# Altium footprint library Control_Board_Model.PcbLib: 160 footprints (part 10 of 10)
Each footprint in its own frame and in the unit in brackets; x right, y up, seen from the top. Pads: shape width x height; smd on the part's side, far side on the other; paste and mask are expansions set on the pad; w line width, h text height; cw(c..) or ccw(c..) is an arc to the next point about the centre after c.
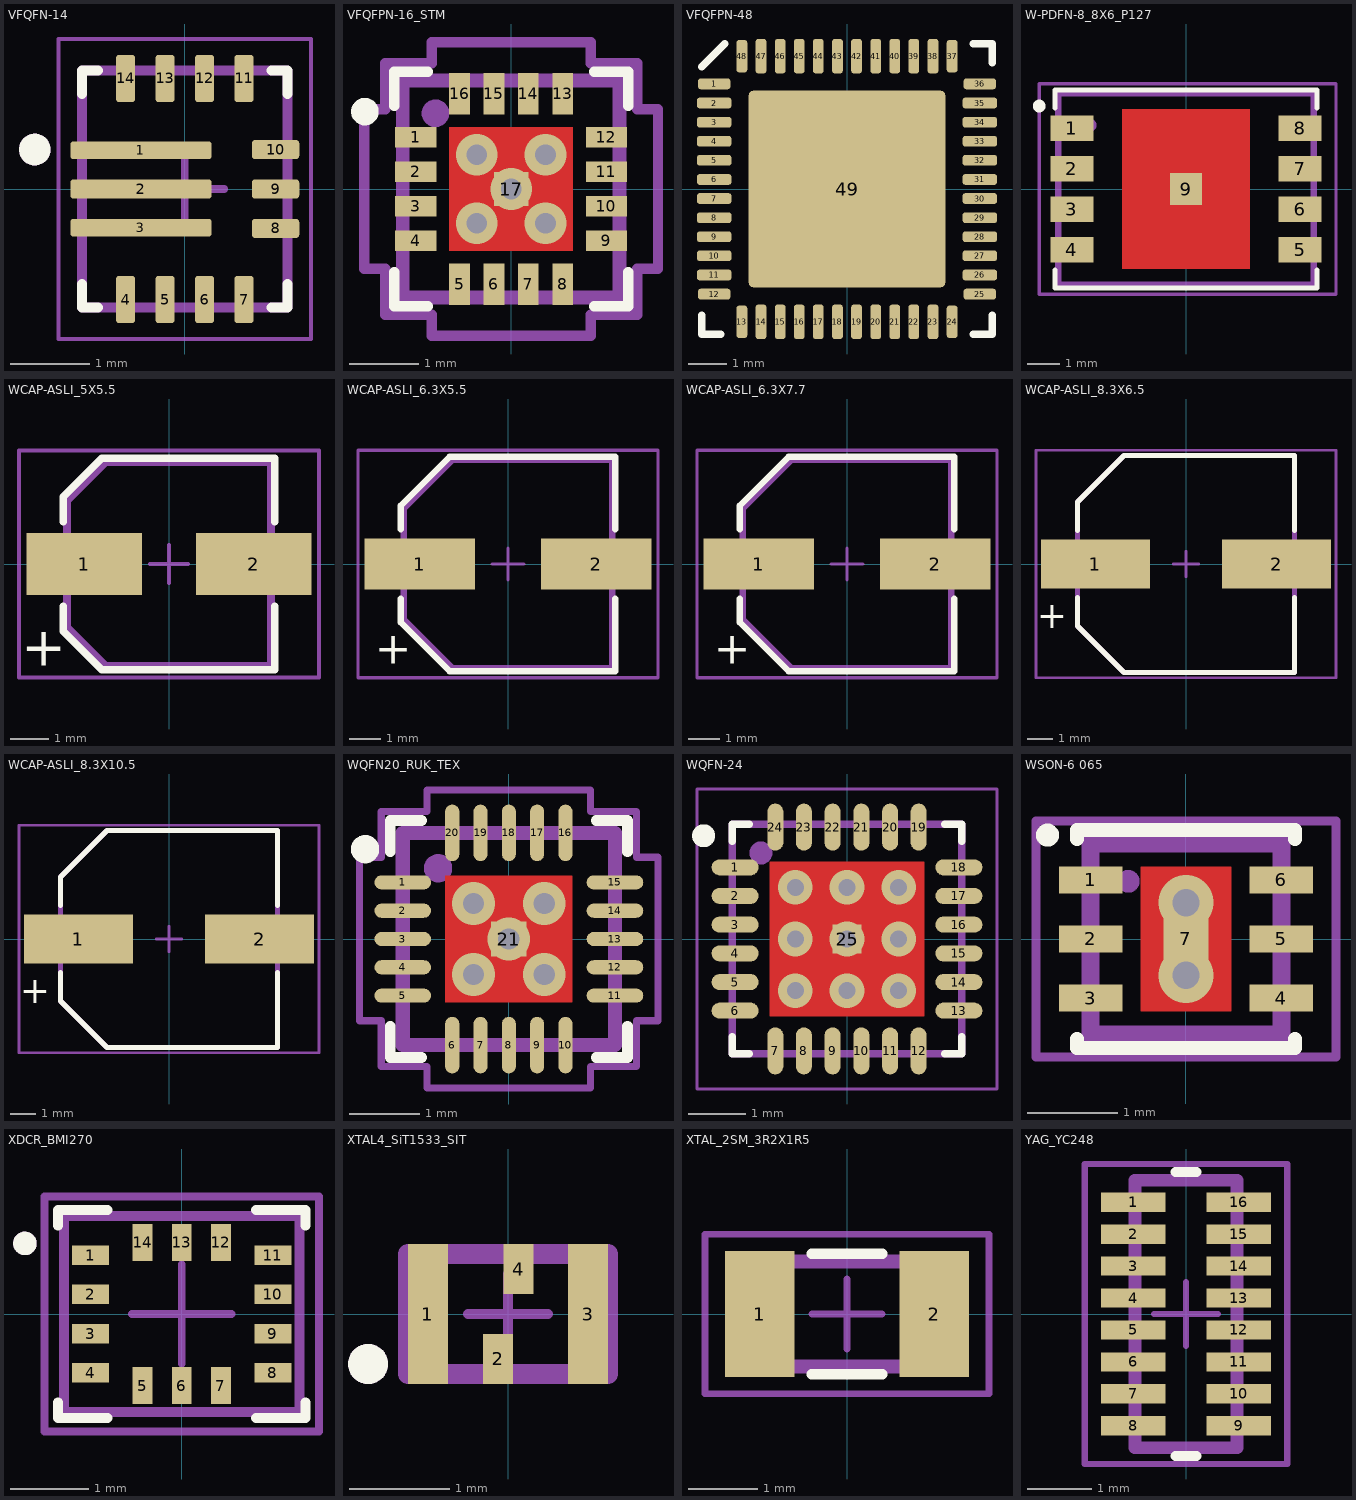
[diagram p9: the footprints below, top view; thin cyan lines are the x and y axes]

## VFQFN-14 [mm]
height 0.9
pads (14):
  rrect30% 1.79x0.22 smd paste-2 mask+0.05: 1(-0.555,0.49) 3(-0.555,-0.49)
  rrect30% 1.79x0.24 smd paste-2 mask+0.05: 2(-0.555,0)
  rrect30% 0.24x0.6 smd mask+0.05: 4(-0.75,-1.4) 5(-0.25,-1.4) 6(0.25,-1.4) 7(0.75,-1.4) 11(0.75,1.4) 12(0.25,1.4) 13(-0.25,1.4) 14(-0.75,1.4)
  rrect30% 0.6x0.24 smd mask+0.05: 8(1.15,-0.5) 9(1.15,0) 10(1.15,0.5)
Top Overlay:
  circle w0.2: c-1.9,0.5 r0.1
  lines w0.127: -1.3,-1.205 -1.3,-1.5 -1.1,-1.5 ; -1.3,1.205 -1.3,1.5 -1.1,1.5 ; 1.1,-1.5 1.3,-1.5 1.3,-1.205 ; 1.1,1.5 1.3,1.5 1.3,1.205
Top Paste:
  drawing of 6 lines, arcs and shapes, not listed
Mechanical 14:
  circle w0.2: c-1.9,0.5 r0.1
  lines w0.127: -1.3,-1.5 -1.3,1.5 ; -1.3,-1.5 1.3,-1.5 ; -1.3,-1.5 1.3,-1.5 ; -1.3,1.5 1.3,1.5 ; -1.3,1.5 1.3,1.5 ; 1.3,-1.5 1.3,1.5
Mechanical 15:
  lines w0.05: -1.6,-1.9 -1.6,1.9 1.6,1.9 1.6,-1.9 -1.6,-1.9
  lines w0.1: -0.5,0 0.5,0 ; 0,-0.5 0,0.5
3D body: height 0.9, standoff 0, extent -1.299,-1.499 1.299,1.499

## VFQFPN-16_STM [mm]
pads (17):
  rect 0.6x0.3 smd mask+0.05: 1(-1.385,0.75) 2(-1.385,0.25) 3(-1.385,-0.25) 4(-1.385,-0.75) 9(1.385,-0.75) 10(1.385,-0.25) 11(1.385,0.25) 12(1.385,0.75)
  rect 0.3x0.6 smd mask+0.05: 5(-0.75,-1.385) 6(-0.25,-1.385) 7(0.25,-1.385) 8(0.75,-1.385) 13(0.75,1.385) 14(0.25,1.385) 15(-0.25,1.385) 16(-0.75,1.385)
  rect 0.5x0.5 smd mask+0.05: 17(0,0)
via 0,0 diameter 0.605 hole 0.3
via 0.5,-0.5 diameter 0.605 hole 0.3
via -0.5,-0.5 diameter 0.605 hole 0.3
via 0.5,0.5 diameter 0.605 hole 0.3
via -0.5,0.5 diameter 0.605 hole 0.3
Top Layer:
  rectangle: -0.9,-0.9 0.9,0.9
Top Overlay:
  circle w0.2: c-2.125,1.125 r0.1
  lines w0.152: -1.702,-1.21 -1.702,-1.702 -1.21,-1.702 ; -1.702,1.21 -1.702,1.702 -1.21,1.702 ; 1.21,-1.702 1.702,-1.702 1.702,-1.21 ; 1.21,1.702 1.702,1.702 1.702,1.21
Top Paste:
  rectangle: -0.9,-0.9 0.9,0.9
Top Solder:
  rectangle: -0.95,-0.95 0.95,0.95
Mechanical 14:
  circle w0.2: c-1.1,1.1 r0.1
  lines w0.2: -1.575,-1.575 1.575,-1.575 1.575,1.575 -1.575,1.575 -1.575,-1.575
  text "'.Designator'" at -1,-0.2 h0.5
Mechanical 15:
  lines w0.1: -0.5,0 0.5,0 ; 0,-0.5 0,0.5
  lines w0.152: -2.134,-1.156 -1.829,-1.156 -1.829,-1.829 -1.156,-1.829 -1.156,-2.134 1.156,-2.134 1.156,-1.829 1.829,-1.829 1.829,-1.156 2.134,-1.156 2.134,1.156 1.829,1.156 1.829,1.829 1.156,1.829 1.156,2.134 -1.156,2.134 -1.156,1.829 -1.829,1.829 -1.829,1.156 -2.134,1.156 -2.134,-1.156
3D body "VFQFPN-16_STM.step": height 0.94, standoff 0, extent -1.575,-1.575 1.575,1.575

## VFQFPN-48 [mm]
pads (49):
  rrect50% 0.85x0.28 smd: 1(-3.475,2.75) 12(-3.475,-2.75) 25(3.475,-2.75) 36(3.475,2.75)
  rrect50% 0.9x0.28 smd: 2(-3.475,2.25) 3(-3.475,1.75) 4(-3.475,1.25) 5(-3.475,0.75) 6(-3.475,0.25) 7(-3.475,-0.25) 8(-3.475,-0.75) 9(-3.475,-1.25) 10(-3.475,-1.75) 11(-3.475,-2.25) 26(3.475,-2.25) 27(3.475,-1.75) 28(3.475,-1.25) 29(3.475,-0.75) 30(3.475,-0.25) 31(3.475,0.25) 32(3.475,0.75) 33(3.475,1.25) 34(3.475,1.75) 35(3.475,2.25)
  rrect50% 0.28x0.85 smd: 13(-2.75,-3.475) 24(2.75,-3.475) 37(2.75,3.475) 48(-2.75,3.475)
  rrect50% 0.28x0.9 smd: 14(-2.25,-3.475) 15(-1.75,-3.475) 16(-1.25,-3.475) 17(-0.75,-3.475) 18(-0.25,-3.475) 19(0.25,-3.475) 20(0.75,-3.475) 21(1.25,-3.475) 22(1.75,-3.475) 23(2.25,-3.475) 38(2.25,3.475) 39(1.75,3.475) 40(1.25,3.475) 41(0.75,3.475) 42(0.25,3.475) 43(-0.25,3.475) 44(-0.75,3.475) 45(-1.25,3.475) 46(-1.75,3.475) 47(-2.25,3.475)
  rrect5% 5.15x5.15 smd: 49(0,0)
Top Overlay:
  lines w0.2: -3.8,-3.3 -3.8,-3.8 -3.3,-3.8 ; -3.8,3.2 -3.2,3.8 ; 3.3,-3.8 3.8,-3.8 3.8,-3.3 ; 3.3,3.8 3.8,3.8 3.8,3.3
3D body "ALSRobot-QFN48 7x7.step": height 0.78, standoff -0.02, extent -3.51,-3.51 3.51,3.51

## W-PDFN-8_8X6_P127 [mm]
pads (9):
  rect 1.35x0.8 smd mask+0.05: 1(-3.575,1.905) 2(-3.575,0.635) 3(-3.575,-0.635) 4(-3.575,-1.905) 5(3.575,-1.905) 6(3.575,-0.635) 7(3.575,0.635) 8(3.575,1.905)
  rect 1x1 smd mask+0.05: 9(0,0)
Top Layer:
  rectangle: -2,-2.5 2,2.5
Top Overlay:
  circle w0.2: c-4.6,2.6 r0.1
  lines w0.152: -4.1,-2.54 -4.1,-3.1 4.1,-3.1 4.1,-2.54 ; -4.1,2.54 -4.1,3.1 4.1,3.1 4.1,2.54
Top Paste:
  rectangle: -2,-2.5 2,2.5
Top Solder:
  rectangle: -2.05,-2.55 2.05,2.55
Mechanical 14:
  circle w0.2: c-3,2 r0.1
  lines w0.2: 4,3 -4,3 -4,-3 4,-3 4,3 ; 4,3 4,3
  text ".Designator" at -1.1,-0.2 h0.5
Mechanical 15:
  lines w0.1: -0.635,0 0.635,0 ; 0,-0.635 0,0.635 ; -4.6,-3.3 -4.6,3.3 4.7,3.3 4.7,-3.3 -4.6,-3.3
3D body: height 0.8, standoff 0, extent -4.005,-3.005 4.005,3.005

## WCAP-ASLI_5X5.5 [mm] "Aluminium Electrolytic V-Chip SMT Capacitors, 5x5.5mm"
height 5.5
pads (2):
  rect 3x1.6 smd: 1(-2.2,0) 2(2.2,0)
Top Overlay:
  lines w0.2: -2.75,-1.1 -2.75,-1.75 -1.75,-2.75 2.75,-2.75 2.75,-1.1 ; -2.75,1.1 -2.75,1.75 -1.75,2.75 2.75,2.75 2.75,1.1
  text "+" at -2.667,-1.778 h1.02
Mechanical 14:
  lines w0.2: -2.65,-1.65 -1.65,-2.65 2.65,-2.65 2.65,2.65 -1.65,2.65 -2.65,1.65 -2.65,-1.65
  text "'.Designator'" at 0.254,-0.635 h0.5
  text "+" at -1.524,0.508 h1.02
Mechanical 15:
  lines w0.1: -0.5,0 0.5,0 ; 0,-0.5 0,0.5 ; -3.9,-2.95 -3.9,2.95 3.9,2.95 3.9,-2.95 -3.9,-2.95
3D body "5x5.5x1.4.stp": height 5.5, standoff 0, extent -3,-2.65 3,2.65

## WCAP-ASLI_6.3X5.5 [mm] "Aluminium Electrolytic V-Chip SMT Capacitors, 6.3x5.5mm"
height 5.5
pads (2):
  rect 3.5x1.6 smd: 1(-2.8,0) 2(2.8,0)
Top Overlay:
  lines w0.2: -3.4,-1.1 -3.4,-1.85 -1.85,-3.4 3.4,-3.4 3.4,-1.1 ; -3.4,1.1 -3.4,1.85 -1.85,3.4 3.4,3.4 3.4,1.1
  text "+" at -3.048,-2.286 h1.02
Mechanical 14:
  lines w0.2: -3.3,-1.75 -1.75,-3.3 3.3,-3.3 3.3,3.3 -1.75,3.3 -3.3,1.75 -3.3,-1.75
  text "'.Designator'" at -0.635,0 h0.5
  text "+" at -2.159,0.508 h1.02
Mechanical 15:
  lines w0.1: -0.5,0 0.5,0 ; 0,-0.5 0,0.5 ; -4.75,-3.6 -4.75,3.6 4.75,3.6 4.75,-3.6 -4.75,-3.6
3D body "6.3x5.5x2.2.stp": height 5.5, standoff 0, extent -3.65,-3.3 3.65,3.3

## WCAP-ASLI_6.3X7.7 [mm] "Aluminium Electrolytic V-Chip SMT Capacitors, 6.3x7.7mm"
pads (2):
  rect 3.5x1.6 smd: 1(-2.8,0) 2(2.8,0)
Top Overlay:
  lines w0.2: -3.4,-1.1 -3.4,-1.85 -1.85,-3.4 3.4,-3.4 3.4,-1.1 ; -3.4,1.1 -3.4,1.85 -1.85,3.4 3.4,3.4 3.4,1.1
  text "+" at -3.048,-2.286 h1.02
Mechanical 14:
  lines w0.2: -3.3,-1.75 -3.3,1.75 -1.75,3.3 3.3,3.3 3.3,-3.3 -1.75,-3.3 -3.3,-1.75
  text "+" at -2.159,0.508 h1.02
  text "'.Designator'" at -0.635,0 h0.5
Mechanical 15:
  lines w0.1: -0.5,0 0.5,0 ; 0,-0.5 0,0.5 ; -4.75,-3.6 4.75,-3.6 4.75,3.6 -4.75,3.6 -4.75,-3.6
3D body "Download_STP_865060x4500x (rev1).stp": height 7.55, standoff -0.15, extent -3.65,-3.3 3.65,3.3

## WCAP-ASLI_8.3X6.5 [mm] "Aluminium Electrolytic V-Chip SMT Capacitors, 8.3x6.5mm"
pads (2):
  rect 4.2x1.9 smd: 1(-3.5,0) 2(3.5,0)
Top Overlay:
  lines w0.2: -4.2,-1.3 -4.2,-2.4 -2.4,-4.2 4.2,-4.2 4.2,-1.3 ; -4.2,1.3 -4.2,2.4 -2.4,4.2 4.2,4.2 4.2,1.3
  text "+" at -4.6,-1.6 h1.02
Mechanical 14:
  lines w0.2: -4.2,-2.4 -4.2,2.4 -2.4,4.2 4.2,4.2 4.2,-4.2 -2.4,-4.2 -4.2,-2.4
  text "'.Designator'" at -0.635,0 h0.5
  text "+" at -2.159,0.508 h1.02
Mechanical 15:
  lines w0.1: -0.5,0 0.5,0 ; 0,-0.5 0,0.5 ; -5.8,-4.4 -5.8,4.4 5.8,4.4 5.8,-4.4 -5.8,-4.4
3D body "Download_STP_865080x4901x (rev1).stp": height 6.35, standoff -0.15, extent -4.5,-4.1 4.5,4.2

## WCAP-ASLI_8.3X10.5 [mm] "Aluminium Electrolytic V-Chip SMT Capacitors, 8.3x10.5mm"
pads (2):
  rect 4.2x1.9 smd: 1(-3.5,0) 2(3.5,0)
Top Overlay:
  lines w0.2: -4.2,-1.3 -4.2,-2.4 -2.4,-4.2 4.2,-4.2 4.2,-1.3 ; -4.2,1.3 -4.2,2.4 -2.4,4.2 4.2,4.2 4.2,1.3
  text "+" at -4.6,-1.6 h1.02
Mechanical 14:
  lines w0.2: -4.2,-2.4 -2.4,-4.2 4.2,-4.2 4.2,4.2 -2.4,4.2 -4.2,2.4 -4.2,-2.4
  text "+" at -2.159,0.508 h1.02
  text "'.Designator'" at -0.635,0 h0.5
Mechanical 15:
  lines w0.1: -0.5,0 0.5,0 ; 0,-0.5 0,0.5 ; -5.8,-4.4 5.8,-4.4 5.8,4.4 -5.8,4.4 -5.8,-4.4
3D body "Download_STP_86508xx530xx (rev1).stp": height 10.35, standoff -0.15, extent -4.5,-4.15 4.5,4.15

## WQFN20_RUK_TEX [mm]
pads (21):
  rrect100% 0.8x0.2 smd mask+0.05: 1(-1.5,0.8) 2(-1.5,0.4) 3(-1.5,0) 4(-1.5,-0.4) 5(-1.5,-0.8) 11(1.5,-0.8) 12(1.5,-0.4) 13(1.5,0) 14(1.5,0.4) 15(1.5,0.8)
  rrect100% 0.2x0.8 smd mask+0.05: 6(-0.8,-1.5) 7(-0.4,-1.5) 8(0,-1.5) 9(0.4,-1.5) 10(0.8,-1.5) 16(0.8,1.5) 17(0.4,1.5) 18(0,1.5) 19(-0.4,1.5) 20(-0.8,1.5)
  rect 0.5x0.5 smd paste-2 mask+0.05: 21(0,0)
via 0,0 diameter 0.605 hole 0.3
via -0.5,0.5 diameter 0.605 hole 0.3
via 0.5,0.5 diameter 0.605 hole 0.3
via -0.5,-0.5 diameter 0.605 hole 0.3
via 0.5,-0.5 diameter 0.605 hole 0.3
Top Layer:
  rectangle: -0.9,-0.9 0.9,0.9
Top Overlay:
  circle w0.2: c-2.032,1.27 r0.1
  lines w0.152: -1.676,-1.234 -1.676,-1.676 -1.234,-1.676 ; -1.676,1.234 -1.676,1.676 -1.234,1.676 ; 1.234,-1.676 1.676,-1.676 1.676,-1.234 ; 1.234,1.676 1.676,1.676 1.676,1.234
Top Paste:
  rectangle: -0.85,0.15 -0.15,0.85
  region: -0.15,-0.85 -0.15,-0.15 -0.85,-0.15 -0.85,-0.85
  region: 0.85,-0.15 0.15,-0.15 0.15,-0.85 0.85,-0.85
  region: 0.15,0.85 0.15,0.15 0.85,0.15 0.85,0.85
Top Solder:
  rectangle: -0.95,-0.95 0.95,0.95
Mechanical 14:
  circle w0.2: c-1,1 r0.1
  lines w0.2: -1.5,-1.5 1.5,-1.5 1.5,1.5 -1.5,1.5 -1.5,-1.5
  text "'.Designator'" at -0.8,-0.3 h0.5
Mechanical 15:
  lines w0.1: -0.5,0 0.5,0 ; 0,-0.5 0,0.5 ; -2.108,-1.156 -1.803,-1.156 -1.803,-1.803 -1.156,-1.803 -1.156,-2.108 1.156,-2.108 1.156,-1.803 1.803,-1.803 1.803,-1.156 2.108,-1.156 2.108,1.156 1.803,1.156 1.803,1.803 1.156,1.803 1.156,2.108 -1.156,2.108 -1.156,1.803 -1.803,1.803 -1.803,1.156 -2.108,1.156 -2.108,-1.156
3D body "RUK0020B.stp": height 0.8, standoff 0, extent -1.5,-1.5 1.5,1.5

## WQFN-24 [mm] "WQFN24 Plastic Quad Flatpack No-Lead"
height 0.8
pads (25):
  rrect100% 0.82x0.28 smd paste-0.025 mask+0.05: 1(-1.95,1.25) 2(-1.95,0.75) 3(-1.95,0.25) 4(-1.95,-0.25) 5(-1.95,-0.75) 6(-1.95,-1.25) 13(1.95,-1.25) 14(1.95,-0.75) 15(1.95,-0.25) 16(1.95,0.25) 17(1.95,0.75) 18(1.95,1.25)
  rrect100% 0.28x0.82 smd paste-0.025 mask+0.05: 7(-1.25,-1.95) 8(-0.75,-1.95) 9(-0.25,-1.95) 10(0.25,-1.95) 11(0.75,-1.95) 12(1.25,-1.95) 19(1.25,1.95) 20(0.75,1.95) 21(0.25,1.95) 22(-0.25,1.95) 23(-0.75,1.95) 24(-1.25,1.95)
  rect 0.5x0.5 smd paste-5 mask+0.05: 25(0,0)
via 0.9,-0.9 diameter 0.605 hole 0.3
via 0,-0.9 diameter 0.605 hole 0.3
via -0.9,-0.9 diameter 0.605 hole 0.3
via -0.9,0.9 diameter 0.605 hole 0.3
via 0,0.9 diameter 0.605 hole 0.3
via 0.9,0.9 diameter 0.605 hole 0.3
via 0.9,0 diameter 0.605 hole 0.3
via -0.9,0 diameter 0.605 hole 0.3
via 0,0 diameter 0.605 hole 0.3
Top Layer:
  rectangle: -1.35,-1.35 1.35,1.35
Top Overlay:
  circle w0.2: c-2.5,1.8 r0.1
  lines w0.127: -2,-1.705 -2,-2 -1.705,-2 ; -2,1.705 -2,2 -1.705,2 ; 1.705,-2 2,-2 2,-1.705 ; 1.705,2 2,2 2,1.705
Top Paste:
  rectangle: -1.25,0.15 -0.15,1.25
  region: -0.15,-1.25 -0.15,-0.15 -1.25,-0.15 -1.25,-1.25
  region: 1.25,-0.15 0.15,-0.15 0.15,-1.25 1.25,-1.25
  region: 0.15,1.25 0.15,0.15 1.25,0.15 1.25,1.25
Top Solder:
  rectangle: -1.4,-1.4 1.4,1.4
Mechanical 14:
  circle w0.2: c-1.5,1.5 r0.1
  lines w0.127: -2,-2 2,-2 ; -2,-2 -2,2 ; -2,-2 2,-2 ; -2,-2 -2,2 ; -2,2 2,2 ; -2,2 2,2 ; 2,-2 2,2 ; 2,-2 2,2
  text "'.Designator'" at -0.9,-0.2 h0.5
Mechanical 15:
  lines w0.05: -2.615,-2.615 2.615,-2.615 2.615,2.615 -2.615,2.615 -2.615,-2.615
  lines w0.1: -0.5,0 0.5,0 ; 0,-0.5 0,0.5
3D body "BQ25611DRTWT.STEP": height 0.8, standoff 0, extent -2,-2 2,2

## WSON-6 065 [mm]
height 0.8
pads (7):
  rect 0.7x0.3 smd mask+0.05: 1(-1.05,0.65) 2(-1.05,0) 3(-1.05,-0.65) 4(1.05,-0.65) 5(1.05,0) 6(1.05,0.65)
  rect 0.5x0.5 smd mask+0.05: 7(0,0)
via 0,0.4 diameter 0.605 hole 0.3
via 0,-0.4 diameter 0.605 hole 0.3
Top Layer:
  rectangle: -0.5,-0.8 0.5,0.8
Top Overlay:
  circle w0.152: c-1.524,1.143 r0.051
  lines w0.152: -1.2,-1.1 -1.2,-1.2 1.2,-1.2 1.2,-1.1 ; -1.2,1.1 -1.2,1.2 1.2,1.2 1.2,1.1
Top Paste:
  rectangle: -0.5,-0.8 0.5,0.8
Top Solder:
  rectangle: -0.55,-0.85 0.55,0.85
Mechanical 14:
  circle w0.15: c-0.635,0.635 r0.05
  lines w0.2: -1.05,-1.05 -1.05,1.05 1.05,1.05 1.05,-1.05 -1.05,-1.05
  text "'.Designator'" at 0.254,-0.635 h0.5
Mechanical 15:
  lines w0.1: -0.4,0 0.4,0 ; 0,-0.4 0,0.4 ; -1.651,-1.3 1.651,-1.3 1.651,1.3 -1.651,1.3 -1.651,-1.3
3D body "WSON-6.STEP": height 0.8, standoff 0, extent -1.05,-1.05 1.05,1.05

## XDCR_BMI270 [mm]
pads (14):
  rect 0.475x0.25 smd mask+0.05: 1(-1.162,0.75) 2(-1.162,0.25) 3(-1.162,-0.25) 4(-1.162,-0.75) 8(1.162,-0.75) 9(1.162,-0.25) 10(1.162,0.25) 11(1.162,0.75)
  rect 0.25x0.475 smd mask+0.05: 5(-0.5,-0.913) 6(0,-0.913) 7(0.5,-0.913) 12(0.5,0.913) 13(0,0.913) 14(-0.5,0.913)
Top Overlay:
  circle w0.15: c-2,0.9 r0.075
  lines w0.127: -1.575,-1.125 -1.575,-1.325 -0.945,-1.325 ; -1.575,1.125 -1.575,1.325 -0.945,1.325 ; 0.945,-1.325 1.575,-1.325 1.575,-1.125 ; 0.945,1.325 1.575,1.325 1.575,1.125
Mechanical 14:
  circle w0.15: c-2,0.9 r0.075
  lines w0.127: -1.5,-1.25 -1.5,1.25 1.5,1.25 1.5,-1.25 -1.5,-1.25
  text "'.Designator'" at -0.9,-0.2 h0.5
Mechanical 15:
  lines w0.1: -0.635,0 0.635,0 ; 0,-0.635 0,0.635 ; -1.75,-1.5 1.75,-1.5 1.75,1.5 -1.75,1.5 -1.75,-1.5
3D body "User Library-LGA-14 2_5x3-1.STEP": height 0.86, standoff 0, extent -1.5,-1.25 1.5,1.25

## XTAL4_SiT1533_SIT [mm]
pads (4):
  rect 0.4x1.4 smd paste+0 mask+0.05: 1(-0.8,0) 3(0.8,0)
  rect 0.3x0.5 smd paste+0 mask+0.05: 2(-0.099,-0.45) 4(0.106,0.45)
Top Overlay:
  circle w0.2: c-1.4,-0.5 r0.1
Mechanical 14:
  circle w0.2: c-1.4,-0.5 r0.1
  lines w0.2: -1,-0.6 -1,0.6 1,0.6 1,-0.6 -1,-0.6
  text "'.Designator'" at -0.7,-0.3 h0.5
Mechanical 15:
  lines w0.1: -0.4,0 0.4,0 ; 0,-0.4 0,0.4 ; -1,0 -1,0.6 0,0.6 1,0.6 1,0 ; -1,0 -1.003,0 -1,0 ; -1,0 -1,-0.6 0,-0.6 1,-0.6 1,0 ; 1,0 1.003,0 1,0
3D body "SMD_2012_4pins.stp": height 0.55, standoff -0.05, extent -1,-0.6 1,0.6

## XTAL_2SM_3R2X1R5 [mm]
pads (2):
  rect 1x1.8 smd: 1(-1.25,0) 2(1.25,0)
Top Overlay:
  lines w0.152: -0.508,-0.864 0.508,-0.864 ; -0.508,0.864 0.508,0.864
Mechanical 14:
  lines w0.2: -1.6,-0.75 1.6,-0.75 1.6,0.75 -1.6,0.75 -1.6,-0.75
  text ".Designator" at -1.1,-0.2 h0.5
Mechanical 15:
  lines w0.1: -0.5,0 0.5,0 ; 0,-0.5 0,0.5 ; -2.032,-1.143 2.032,-1.143 2.032,1.143 -2.032,1.143 -2.032,-1.143
3D body: height 0.8, standoff 0, extent -1.6,-0.75 1.6,0.75

## YAG_YC248 [mm]
pads (16):
  rect 1.016x0.3 smd: 1(-0.826,1.75) 2(-0.826,1.25) 3(-0.826,0.75) 4(-0.826,0.25) 5(-0.826,-0.25) 6(-0.826,-0.75) 7(-0.826,-1.25) 8(-0.826,-1.75) 9(0.826,-1.75) 10(0.826,-1.25) 11(0.826,-0.75) 12(0.826,-0.25) 13(0.826,0.25) 14(0.826,0.75) 15(0.826,1.25) 16(0.826,1.75)
Top Overlay:
  lines w0.152: -0.163,-2.222 0.163,-2.222 ; -0.163,2.222 0.163,2.222
Mechanical 13:
  lines w0: -0.8,-1.572 ccw(c-0.8,-1.5) -0.8,-1.428 ; -0.8,-1.072 ccw(c-0.8,-1) -0.8,-0.928 ; -0.8,-0.572 ccw(c-0.8,-0.5) -0.8,-0.428 ; -0.8,-0.072 ccw(c-0.8,0) -0.8,0.072 ; -0.8,0.428 ccw(c-0.8,0.5) -0.8,0.572 ; -0.8,0.928 ccw(c-0.8,1) -0.8,1.072 ; -0.8,1.428 ccw(c-0.8,1.5) -0.8,1.572 ; 0.8,-1.572 cw(c0.8,-1.5) 0.8,-1.428 ; 0.8,-1.072 cw(c0.8,-1) 0.8,-0.928 ; 0.8,-0.572 cw(c0.8,-0.5) 0.8,-0.428 ; 0.8,-0.072 cw(c0.8,0) 0.8,0.072 ; 0.8,0.428 cw(c0.8,0.5) 0.8,0.572 ; 0.8,0.928 cw(c0.8,1) 0.8,1.072 ; 0.8,1.428 cw(c0.8,1.5) 0.8,1.572
Mechanical 14:
  lines w0.2: -0.8,-2.096 0.8,-2.096 0.8,2.096 -0.8,2.096 -0.8,-2.096
  text "'.Designator'" at -0.127,0.889 h0.5
Mechanical 15:
  lines w0.1: -0.5,0 0.5,0 ; 0,-0.5 0,0.5 ; -1.587,-2.349 1.587,-2.349 1.587,2.349 -1.587,2.349 -1.587,-2.349
3D body "YAG_YC248.step": height 0.56, standoff 0, extent -0.8,-2.096 0.8,2.096